# Altium footprint library Elements_LT.PcbLib: 145 footprints (part 10 of 10)
Each footprint in its own frame and in the unit in brackets; x right, y up, seen from the top. Pads: shape width x height; smd on the part's side, far side on the other; paste and mask are expansions set on the pad; w line width, h text height; cw(c..) or ccw(c..) is an arc to the next point about the centre after c.
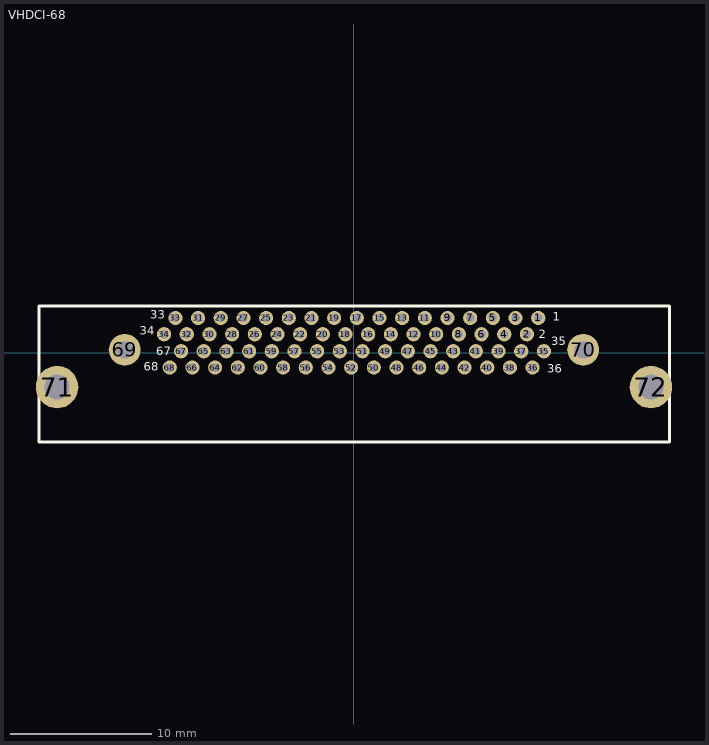
[diagram p9: the footprint, top view; thin cyan lines are the x and y axes]

## VHDCI-68 [mm] "VHDCI, 68 Pins, Angled, Pitch 0.8 mm"
pads (72):
  round 1 hole 0.6: 1(13,2.44) 2(12.2,1.29) 3(11.4,2.44) 4(10.6,1.29) 5(9.8,2.44) 6(9,1.29) 7(8.2,2.44) 8(7.4,1.29) 9(6.6,2.44) 10(5.8,1.29) 11(5,2.44) 12(4.2,1.29) 13(3.4,2.44) 14(2.6,1.29) 15(1.8,2.44) 16(1,1.29) 17(0.2,2.44) 18(-0.6,1.29) 19(-1.4,2.44) 20(-2.2,1.29) 21(-3,2.44) 22(-3.8,1.29) 23(-4.6,2.44) 24(-5.4,1.29) 25(-6.2,2.44) 26(-7,1.29) 27(-7.8,2.44) 28(-8.6,1.29) 29(-9.4,2.44) 30(-10.2,1.29) 31(-11,2.44) 32(-11.8,1.29) 33(-12.6,2.44) 34(-13.4,1.29) 35(13.4,0.09) 36(12.6,-1.06) 37(11.8,0.09) 38(11,-1.06) 39(10.2,0.09) 40(9.4,-1.06) 41(8.6,0.09) 42(7.8,-1.06) 43(7,0.09) 44(6.2,-1.06) 45(5.4,0.09) 46(4.6,-1.06) 47(3.8,0.09) 48(3,-1.06) 49(2.2,0.09) 50(1.4,-1.06) 51(0.6,0.09) 52(-0.2,-1.06) 53(-1,0.09) 54(-1.8,-1.06) 55(-2.6,0.09) 56(-3.4,-1.06) 57(-4.2,0.09) 58(-5,-1.06) 59(-5.8,0.09) 60(-6.6,-1.06) 61(-7.4,0.09) 62(-8.2,-1.06) 63(-9,0.09) 64(-9.8,-1.06) 65(-10.6,0.09) 66(-11.4,-1.06) 67(-12.2,0.09) 68(-13,-1.06)
  round 2.25 hole 1.2: 69(-16.18,0.19) 70(16.17,0.19)
  round 3 hole 1.75: 71(-20.95,-2.44) 72(20.95,-2.44)
Top Overlay:
  lines w0.2: -22.23,-6.31 22.27,-6.31 22.27,3.28 -22.23,3.28 -22.23,-6.31
  text "1" at 14.04,2.23 h0.6
  text "2" at 13.03,1.02 h0.6
  text "35" at 13.93,0.51 h0.6
  text "36" at 13.63,-1.42 h0.6
  text "33" at -14.39,2.37 h0.6
  text "34" at -15.11,1.25 h0.6
  text "67" at -13.97,-0.2 h0.6
  text "68" at -14.83,-1.3 h0.6
3D body "714300008.stp": height 6.28, standoff -2.48, extent -21.36,-11.76 21.34,2.89